# Altium schematic symbol library Блоки трансформаторов импульсных.SCHLIB: 325 symbols (part 2 of 2) (continued)
## БТИ6-46 (continued)
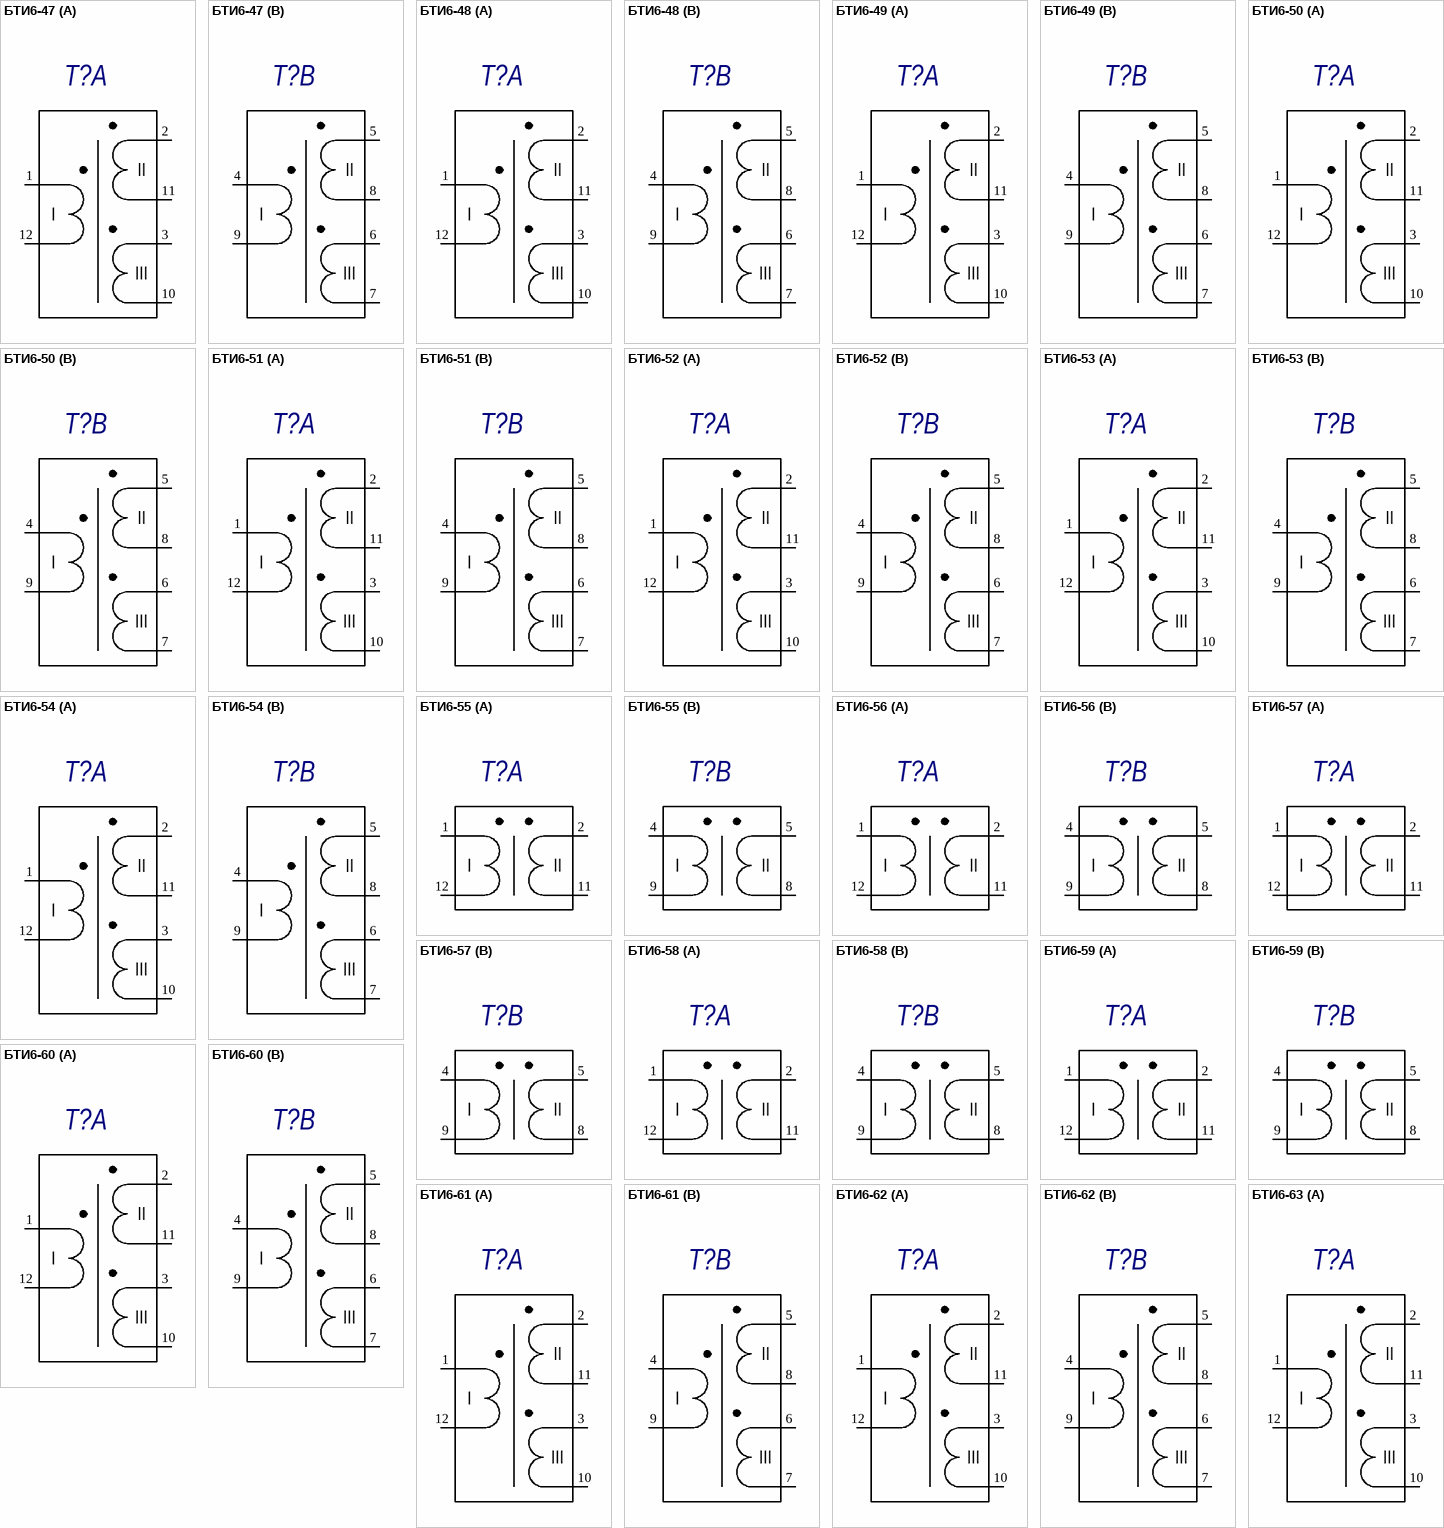
[diagram p22: symbols БТИ6-47 to БТИ6-63]
part A text: II; I; III
part B text: II; I; III

## БТИ6-47
designator T?
БТИ6; Manufacturer: ПАО  «МСТАТОР»; ManufacturerCountry: Россия; Value: {Value}; Наименование элемента: Дроссель; Category: Трансформатор; ComponentLink1Description: Manufacturer Link
footprint БТИ6
part A pins: 1, 2, 3, 10, 11, 12
part B pins: 4, 5, 6, 7, 8, 9
part A text: II; I; III
part B text: II; I; III

## БТИ6-48
designator T?
БТИ6; Manufacturer: ПАО  «МСТАТОР»; ManufacturerCountry: Россия; Value: {Value}; Наименование элемента: Дроссель; Category: Трансформатор; ComponentLink1Description: Manufacturer Link
footprint БТИ6
part A pins: 1, 2, 3, 10, 11, 12
part B pins: 4, 5, 6, 7, 8, 9
part A text: II; I; III
part B text: II; I; III

## БТИ6-49
designator T?
БТИ6; Manufacturer: ПАО  «МСТАТОР»; ManufacturerCountry: Россия; Value: {Value}; Наименование элемента: Дроссель; Category: Трансформатор; ComponentLink1Description: Manufacturer Link
footprint БТИ6
part A pins: 1, 2, 3, 10, 11, 12
part B pins: 4, 5, 6, 7, 8, 9
part A text: II; I; III
part B text: II; I; III

## БТИ6-50
designator T?
БТИ6; Manufacturer: ПАО  «МСТАТОР»; ManufacturerCountry: Россия; Value: {Value}; Наименование элемента: Дроссель; Category: Трансформатор; ComponentLink1Description: Manufacturer Link
footprint БТИ6
part A pins: 1, 2, 3, 10, 11, 12
part B pins: 4, 5, 6, 7, 8, 9
part A text: II; I; III
part B text: II; I; III

## БТИ6-51
designator T?
БТИ6; Manufacturer: ПАО  «МСТАТОР»; ManufacturerCountry: Россия; Value: {Value}; Наименование элемента: Дроссель; Category: Трансформатор; ComponentLink1Description: Manufacturer Link
footprint БТИ6
part A pins: 1, 2, 3, 10, 11, 12
part B pins: 4, 5, 6, 7, 8, 9
part A text: II; I; III
part B text: II; I; III

## БТИ6-52
designator T?
БТИ6; Manufacturer: ПАО  «МСТАТОР»; ManufacturerCountry: Россия; Value: {Value}; Наименование элемента: Дроссель; Category: Трансформатор; ComponentLink1Description: Manufacturer Link
footprint БТИ6
part A pins: 1, 2, 3, 10, 11, 12
part B pins: 4, 5, 6, 7, 8, 9
part A text: II; I; III
part B text: II; I; III

## БТИ6-53
designator T?
БТИ6; Manufacturer: ПАО  «МСТАТОР»; ManufacturerCountry: Россия; Value: {Value}; Наименование элемента: Дроссель; Category: Трансформатор; ComponentLink1Description: Manufacturer Link
footprint БТИ6
part A pins: 1, 2, 3, 10, 11, 12
part B pins: 4, 5, 6, 7, 8, 9
part A text: II; I; III
part B text: II; I; III

## БТИ6-54
designator T?
БТИ6; Manufacturer: ПАО  «МСТАТОР»; ManufacturerCountry: Россия; Value: {Value}; Наименование элемента: Дроссель; Category: Трансформатор; ComponentLink1Description: Manufacturer Link
footprint БТИ6
part A pins: 1, 2, 3, 10, 11, 12
part B pins: 4, 5, 6, 7, 8, 9
part A text: II; I; III
part B text: II; I; III

## БТИ6-55
designator T?
БТИ6; Manufacturer: ПАО  «МСТАТОР»; ManufacturerCountry: Россия; Value: {Value}; Наименование элемента: Дроссель; Category: Трансформатор; ComponentLink1Description: Manufacturer Link
footprint БТИ6
part A pins: 1, 2, 11, 12
part B pins: 4, 5, 8, 9
part A text: I; II
part B text: I; II

## БТИ6-56
designator T?
БТИ6; Manufacturer: ПАО  «МСТАТОР»; ManufacturerCountry: Россия; Value: {Value}; Наименование элемента: Дроссель; Category: Трансформатор; ComponentLink1Description: Manufacturer Link
footprint БТИ6
part A pins: 1, 2, 11, 12
part B pins: 4, 5, 8, 9
part A text: I; II
part B text: I; II

## БТИ6-57
designator T?
БТИ6; Manufacturer: ПАО  «МСТАТОР»; ManufacturerCountry: Россия; Value: {Value}; Наименование элемента: Дроссель; Category: Трансформатор; ComponentLink1Description: Manufacturer Link
footprint БТИ6
part A pins: 1, 2, 11, 12
part B pins: 4, 5, 8, 9
part A text: I; II
part B text: I; II

## БТИ6-58
designator T?
БТИ6; Manufacturer: ПАО  «МСТАТОР»; ManufacturerCountry: Россия; Value: {Value}; Наименование элемента: Дроссель; Category: Трансформатор; ComponentLink1Description: Manufacturer Link
footprint БТИ6
part A pins: 1, 2, 11, 12
part B pins: 4, 5, 8, 9
part A text: I; II
part B text: I; II

## БТИ6-59
designator T?
БТИ6; Manufacturer: ПАО  «МСТАТОР»; ManufacturerCountry: Россия; Value: {Value}; Наименование элемента: Дроссель; Category: Трансформатор; ComponentLink1Description: Manufacturer Link
footprint БТИ6
part A pins: 1, 2, 11, 12
part B pins: 4, 5, 8, 9
part A text: I; II
part B text: I; II

## БТИ6-60
designator T?
БТИ6; Manufacturer: ПАО  «МСТАТОР»; ManufacturerCountry: Россия; Value: {Value}; Наименование элемента: Дроссель; Category: Трансформатор; ComponentLink1Description: Manufacturer Link
footprint БТИ6
part A pins: 1, 2, 3, 10, 11, 12
part B pins: 4, 5, 6, 7, 8, 9
part A text: II; I; III
part B text: II; I; III

## БТИ6-61
designator T?
БТИ6; Manufacturer: ПАО  «МСТАТОР»; ManufacturerCountry: Россия; Value: {Value}; Наименование элемента: Дроссель; Category: Трансформатор; ComponentLink1Description: Manufacturer Link
footprint БТИ6
part A pins: 1, 2, 3, 10, 11, 12
part B pins: 4, 5, 6, 7, 8, 9
part A text: II; I; III
part B text: II; I; III

## БТИ6-62
designator T?
БТИ6; Manufacturer: ПАО  «МСТАТОР»; ManufacturerCountry: Россия; Value: {Value}; Наименование элемента: Дроссель; Category: Трансформатор; ComponentLink1Description: Manufacturer Link
footprint БТИ6
part A pins: 1, 2, 3, 10, 11, 12
part B pins: 4, 5, 6, 7, 8, 9
part A text: II; I; III
part B text: II; I; III

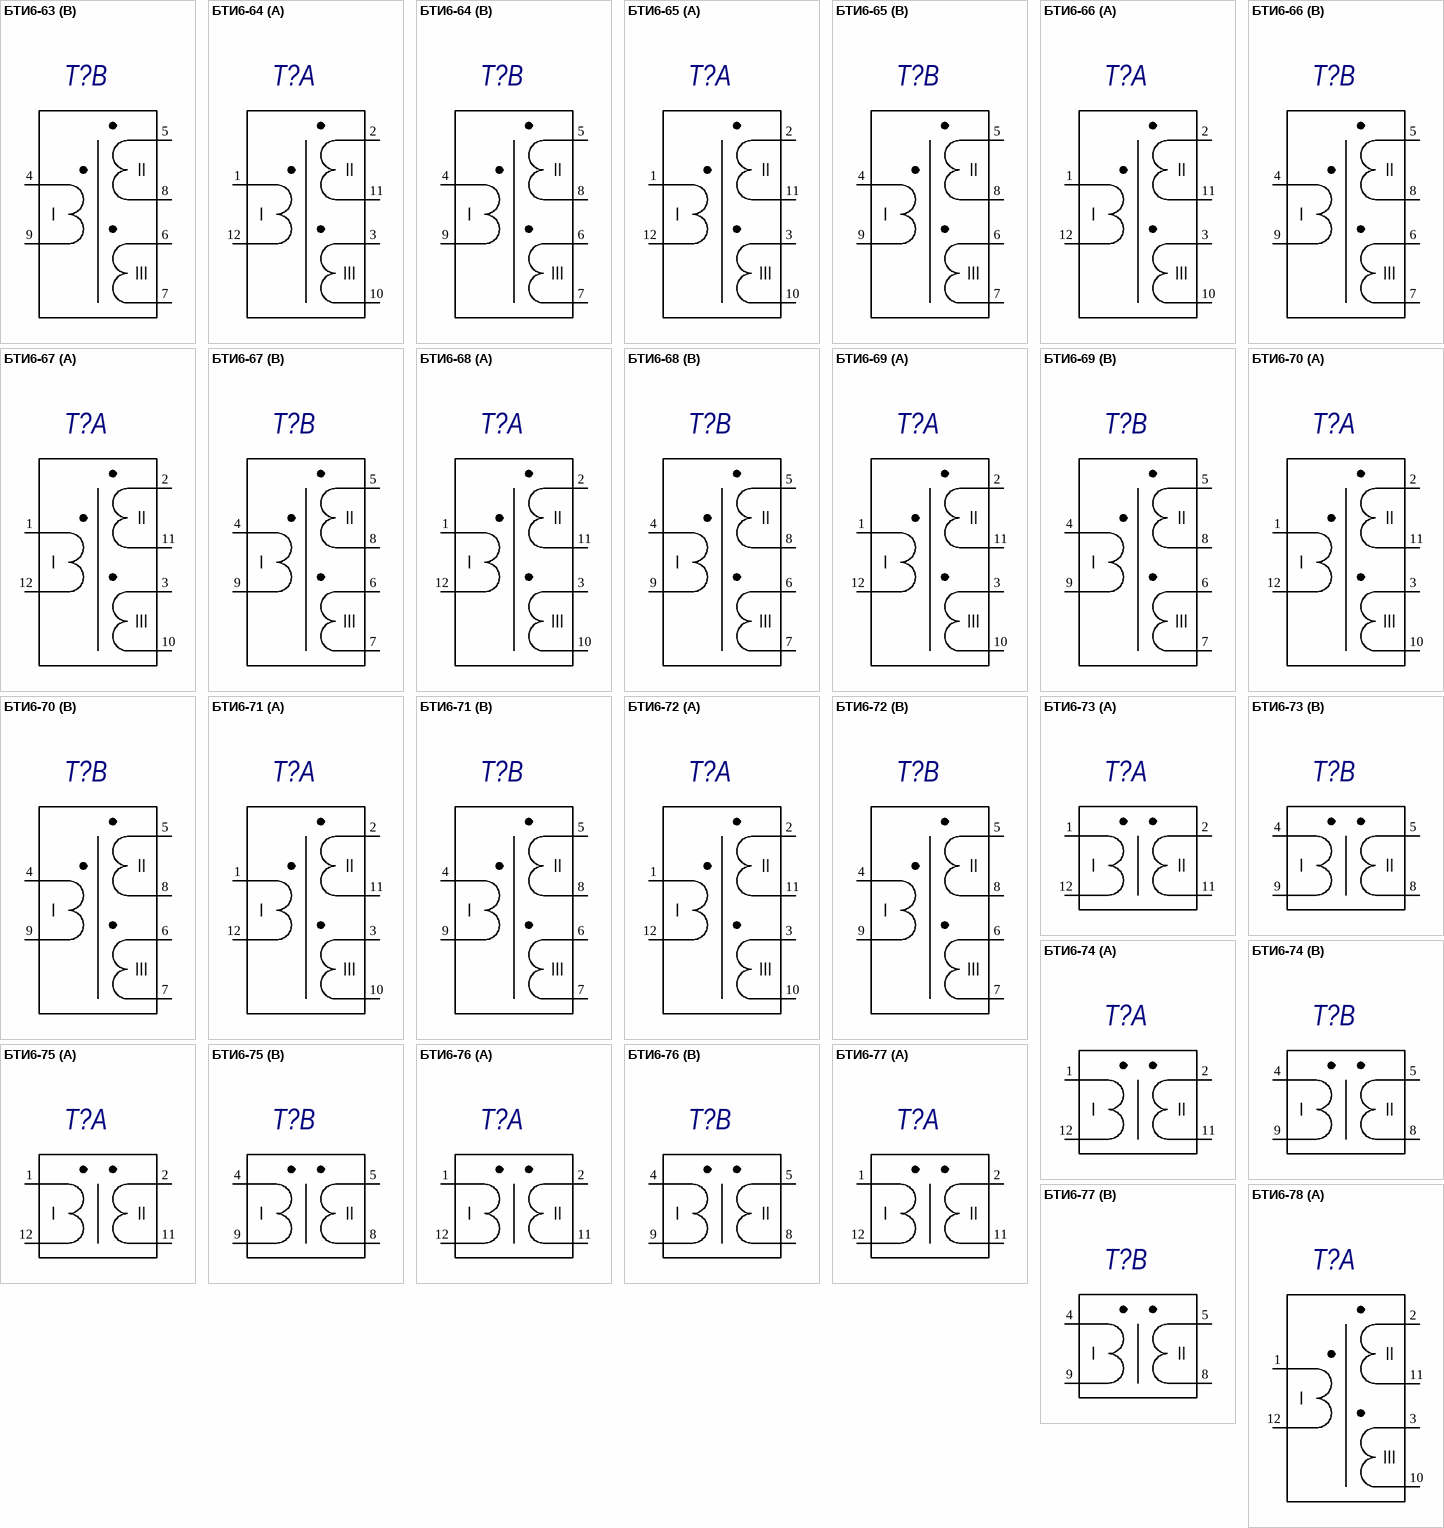
[diagram p23: symbols БТИ6-63 to БТИ6-78]

## БТИ6-63
designator T?
БТИ6; Manufacturer: ПАО  «МСТАТОР»; ManufacturerCountry: Россия; Value: {Value}; Наименование элемента: Дроссель; Category: Трансформатор; ComponentLink1Description: Manufacturer Link
footprint БТИ6
part A pins: 1, 2, 3, 10, 11, 12
part B pins: 4, 5, 6, 7, 8, 9
part A text: II; I; III
part B text: II; I; III

## БТИ6-64
designator T?
БТИ6; Manufacturer: ПАО  «МСТАТОР»; ManufacturerCountry: Россия; Value: {Value}; Наименование элемента: Дроссель; Category: Трансформатор; ComponentLink1Description: Manufacturer Link
footprint БТИ6
part A pins: 1, 2, 3, 10, 11, 12
part B pins: 4, 5, 6, 7, 8, 9
part A text: II; I; III
part B text: II; I; III

## БТИ6-65
designator T?
БТИ6; Manufacturer: ПАО  «МСТАТОР»; ManufacturerCountry: Россия; Value: {Value}; Наименование элемента: Дроссель; Category: Трансформатор; ComponentLink1Description: Manufacturer Link
footprint БТИ6
part A pins: 1, 2, 3, 10, 11, 12
part B pins: 4, 5, 6, 7, 8, 9
part A text: II; I; III
part B text: II; I; III

## БТИ6-66
designator T?
БТИ6; Manufacturer: ПАО  «МСТАТОР»; ManufacturerCountry: Россия; Value: {Value}; Наименование элемента: Дроссель; Category: Трансформатор; ComponentLink1Description: Manufacturer Link
footprint БТИ6
part A pins: 1, 2, 3, 10, 11, 12
part B pins: 4, 5, 6, 7, 8, 9
part A text: II; I; III
part B text: II; I; III

## БТИ6-67
designator T?
БТИ6; Manufacturer: ПАО  «МСТАТОР»; ManufacturerCountry: Россия; Value: {Value}; Наименование элемента: Дроссель; Category: Трансформатор; ComponentLink1Description: Manufacturer Link
footprint БТИ6
part A pins: 1, 2, 3, 10, 11, 12
part B pins: 4, 5, 6, 7, 8, 9
part A text: II; I; III
part B text: II; I; III

## БТИ6-68
designator T?
БТИ6; Manufacturer: ПАО  «МСТАТОР»; ManufacturerCountry: Россия; Value: {Value}; Наименование элемента: Дроссель; Category: Трансформатор; ComponentLink1Description: Manufacturer Link
footprint БТИ6
part A pins: 1, 2, 3, 10, 11, 12
part B pins: 4, 5, 6, 7, 8, 9
part A text: II; I; III
part B text: II; I; III

## БТИ6-69
designator T?
БТИ6; Manufacturer: ПАО  «МСТАТОР»; ManufacturerCountry: Россия; Value: {Value}; Наименование элемента: Дроссель; Category: Трансформатор; ComponentLink1Description: Manufacturer Link
footprint БТИ6
part A pins: 1, 2, 3, 10, 11, 12
part B pins: 4, 5, 6, 7, 8, 9
part A text: II; I; III
part B text: II; I; III

## БТИ6-70
designator T?
БТИ6; Manufacturer: ПАО  «МСТАТОР»; ManufacturerCountry: Россия; Value: {Value}; Наименование элемента: Дроссель; Category: Трансформатор; ComponentLink1Description: Manufacturer Link
footprint БТИ6
part A pins: 1, 2, 3, 10, 11, 12
part B pins: 4, 5, 6, 7, 8, 9
part A text: II; I; III
part B text: II; I; III

## БТИ6-71
designator T?
БТИ6; Manufacturer: ПАО  «МСТАТОР»; ManufacturerCountry: Россия; Value: {Value}; Наименование элемента: Дроссель; Category: Трансформатор; ComponentLink1Description: Manufacturer Link
footprint БТИ6
part A pins: 1, 2, 3, 10, 11, 12
part B pins: 4, 5, 6, 7, 8, 9
part A text: II; I; III
part B text: II; I; III

## БТИ6-72
designator T?
БТИ6; Manufacturer: ПАО  «МСТАТОР»; ManufacturerCountry: Россия; Value: {Value}; Наименование элемента: Дроссель; Category: Трансформатор; ComponentLink1Description: Manufacturer Link
footprint БТИ6
part A pins: 1, 2, 3, 10, 11, 12
part B pins: 4, 5, 6, 7, 8, 9
part A text: II; I; III
part B text: II; I; III

## БТИ6-73
designator T?
БТИ6; Manufacturer: ПАО  «МСТАТОР»; ManufacturerCountry: Россия; Value: {Value}; Наименование элемента: Дроссель; Category: Трансформатор; ComponentLink1Description: Manufacturer Link
footprint БТИ6
part A pins: 1, 2, 11, 12
part B pins: 4, 5, 8, 9
part A text: I; II
part B text: I; II

## БТИ6-74
designator T?
БТИ6; Manufacturer: ПАО  «МСТАТОР»; ManufacturerCountry: Россия; Value: {Value}; Наименование элемента: Дроссель; Category: Трансформатор; ComponentLink1Description: Manufacturer Link
footprint БТИ6
part A pins: 1, 2, 11, 12
part B pins: 4, 5, 8, 9
part A text: I; II
part B text: I; II

## БТИ6-75
designator T?
БТИ6; Manufacturer: ПАО  «МСТАТОР»; ManufacturerCountry: Россия; Value: {Value}; Наименование элемента: Дроссель; Category: Трансформатор; ComponentLink1Description: Manufacturer Link
footprint БТИ6
part A pins: 1, 2, 11, 12
part B pins: 4, 5, 8, 9
part A text: I; II
part B text: I; II

## БТИ6-76
designator T?
БТИ6; Manufacturer: ПАО  «МСТАТОР»; ManufacturerCountry: Россия; Value: {Value}; Наименование элемента: Дроссель; Category: Трансформатор; ComponentLink1Description: Manufacturer Link
footprint БТИ6
part A pins: 1, 2, 11, 12
part B pins: 4, 5, 8, 9
part A text: I; II
part B text: I; II

## БТИ6-77
designator T?
БТИ6; Manufacturer: ПАО  «МСТАТОР»; ManufacturerCountry: Россия; Value: {Value}; Наименование элемента: Дроссель; Category: Трансформатор; ComponentLink1Description: Manufacturer Link
footprint БТИ6
part A pins: 1, 2, 11, 12
part B pins: 4, 5, 8, 9
part A text: I; II
part B text: I; II

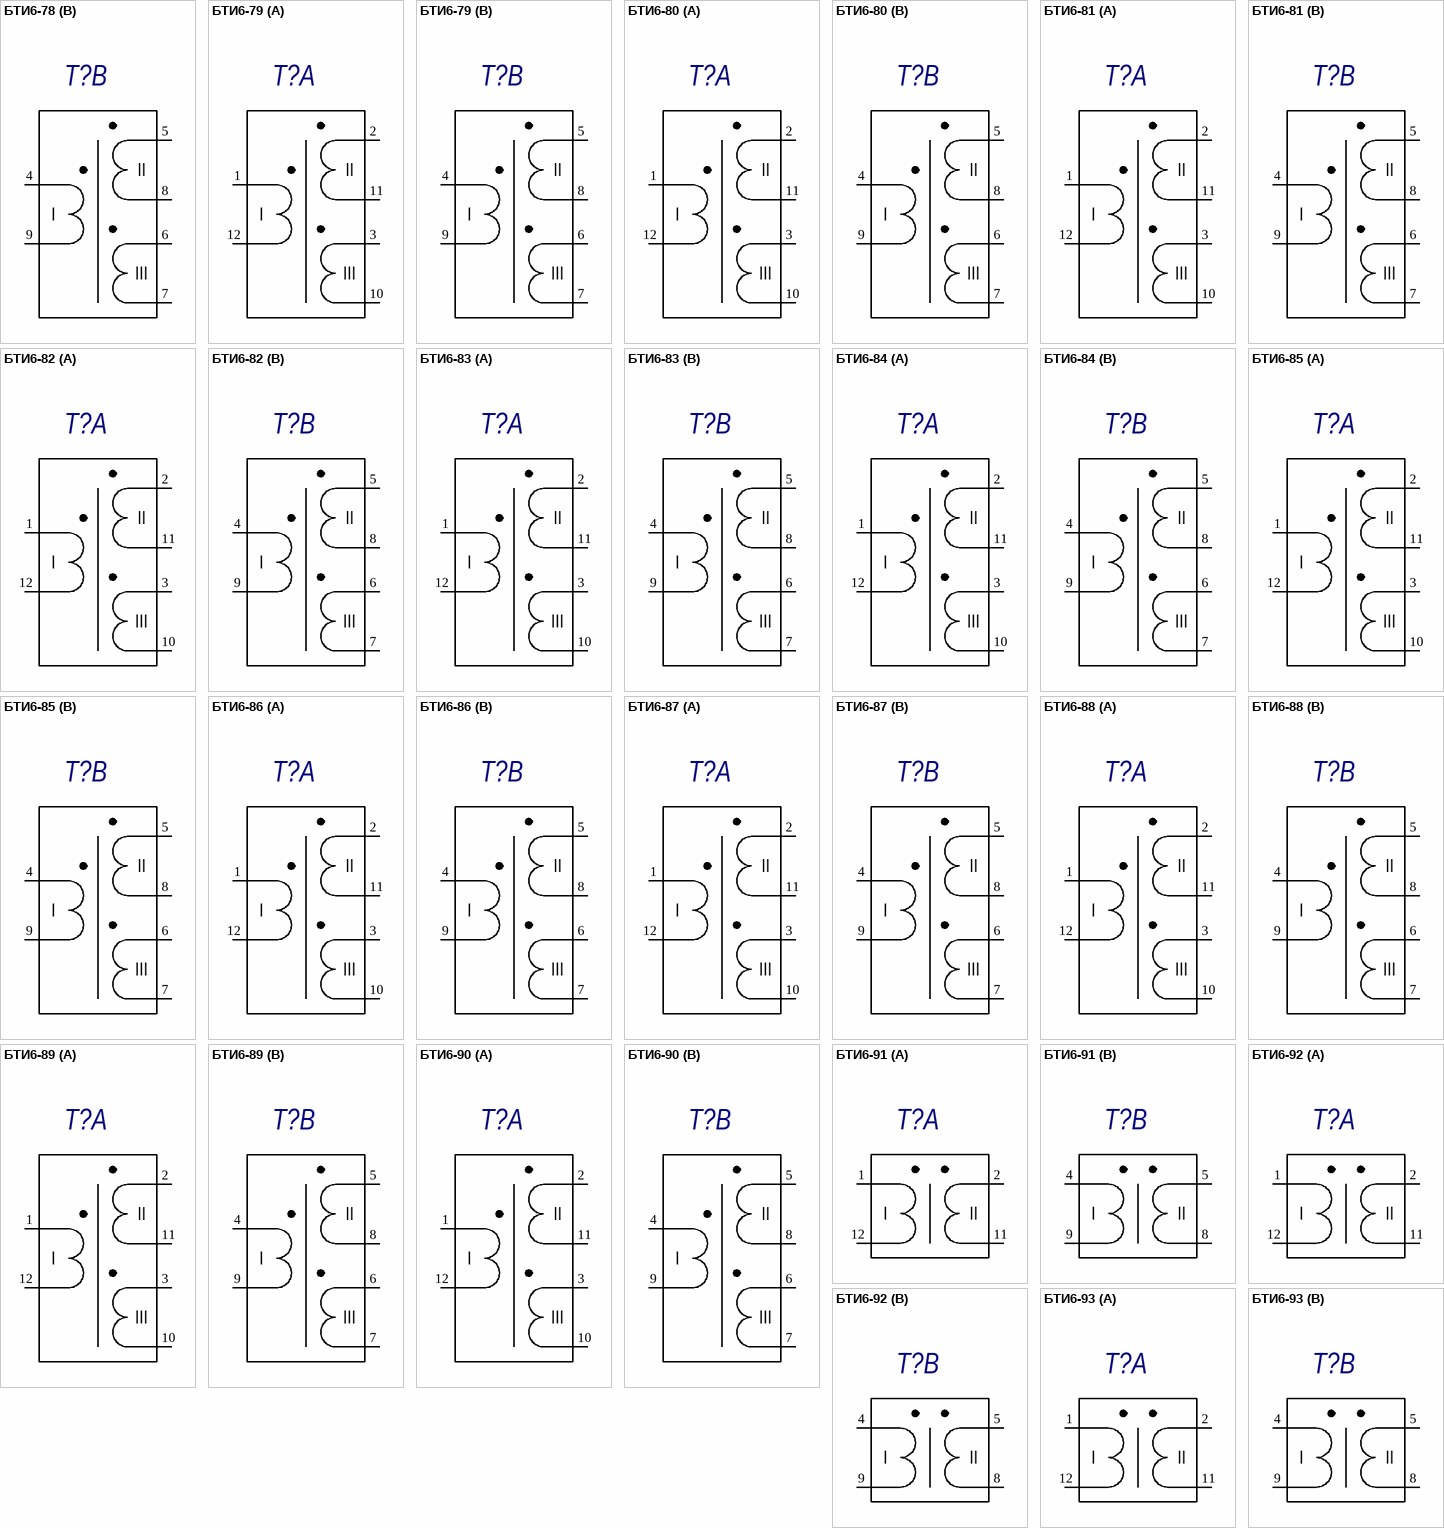
[diagram p24: symbols БТИ6-78 to БТИ6-93]

## БТИ6-78
designator T?
БТИ6; Manufacturer: ПАО  «МСТАТОР»; ManufacturerCountry: Россия; Value: {Value}; Наименование элемента: Дроссель; Category: Трансформатор; ComponentLink1Description: Manufacturer Link
footprint БТИ6
part A pins: 1, 2, 3, 10, 11, 12
part B pins: 4, 5, 6, 7, 8, 9
part A text: II; I; III
part B text: II; I; III

## БТИ6-79
designator T?
БТИ6; Manufacturer: ПАО  «МСТАТОР»; ManufacturerCountry: Россия; Value: {Value}; Наименование элемента: Дроссель; Category: Трансформатор; ComponentLink1Description: Manufacturer Link
footprint БТИ6
part A pins: 1, 2, 3, 10, 11, 12
part B pins: 4, 5, 6, 7, 8, 9
part A text: II; I; III
part B text: II; I; III

## БТИ6-80
designator T?
БТИ6; Manufacturer: ПАО  «МСТАТОР»; ManufacturerCountry: Россия; Value: {Value}; Наименование элемента: Дроссель; Category: Трансформатор; ComponentLink1Description: Manufacturer Link
footprint БТИ6
part A pins: 1, 2, 3, 10, 11, 12
part B pins: 4, 5, 6, 7, 8, 9
part A text: II; I; III
part B text: II; I; III

## БТИ6-81
designator T?
БТИ6; Manufacturer: ПАО  «МСТАТОР»; ManufacturerCountry: Россия; Value: {Value}; Наименование элемента: Дроссель; Category: Трансформатор; ComponentLink1Description: Manufacturer Link
footprint БТИ6
part A pins: 1, 2, 3, 10, 11, 12
part B pins: 4, 5, 6, 7, 8, 9
part A text: II; I; III
part B text: II; I; III

## БТИ6-82
designator T?
БТИ6; Manufacturer: ПАО  «МСТАТОР»; ManufacturerCountry: Россия; Value: {Value}; Наименование элемента: Дроссель; Category: Трансформатор; ComponentLink1Description: Manufacturer Link
footprint БТИ6
part A pins: 1, 2, 3, 10, 11, 12
part B pins: 4, 5, 6, 7, 8, 9
part A text: II; I; III
part B text: II; I; III

## БТИ6-83
designator T?
БТИ6; Manufacturer: ПАО  «МСТАТОР»; ManufacturerCountry: Россия; Value: {Value}; Наименование элемента: Дроссель; Category: Трансформатор; ComponentLink1Description: Manufacturer Link
footprint БТИ6
part A pins: 1, 2, 3, 10, 11, 12
part B pins: 4, 5, 6, 7, 8, 9
part A text: II; I; III
part B text: II; I; III

## БТИ6-84
designator T?
БТИ6; Manufacturer: ПАО  «МСТАТОР»; ManufacturerCountry: Россия; Value: {Value}; Наименование элемента: Дроссель; Category: Трансформатор; ComponentLink1Description: Manufacturer Link
footprint БТИ6
part A pins: 1, 2, 3, 10, 11, 12
part B pins: 4, 5, 6, 7, 8, 9
part A text: II; I; III
part B text: II; I; III

## БТИ6-85
designator T?
БТИ6; Manufacturer: ПАО  «МСТАТОР»; ManufacturerCountry: Россия; Value: {Value}; Наименование элемента: Дроссель; Category: Трансформатор; ComponentLink1Description: Manufacturer Link
footprint БТИ6
part A pins: 1, 2, 3, 10, 11, 12
part B pins: 4, 5, 6, 7, 8, 9
part A text: II; I; III
part B text: II; I; III

## БТИ6-86
designator T?
БТИ6; Manufacturer: ПАО  «МСТАТОР»; ManufacturerCountry: Россия; Value: {Value}; Наименование элемента: Дроссель; Category: Трансформатор; ComponentLink1Description: Manufacturer Link
footprint БТИ6
part A pins: 1, 2, 3, 10, 11, 12
part B pins: 4, 5, 6, 7, 8, 9
part A text: II; I; III
part B text: II; I; III

## БТИ6-87
designator T?
БТИ6; Manufacturer: ПАО  «МСТАТОР»; ManufacturerCountry: Россия; Value: {Value}; Наименование элемента: Дроссель; Category: Трансформатор; ComponentLink1Description: Manufacturer Link
footprint БТИ6
part A pins: 1, 2, 3, 10, 11, 12
part B pins: 4, 5, 6, 7, 8, 9
part A text: II; I; III
part B text: II; I; III

## БТИ6-88
designator T?
БТИ6; Manufacturer: ПАО  «МСТАТОР»; ManufacturerCountry: Россия; Value: {Value}; Наименование элемента: Дроссель; Category: Трансформатор; ComponentLink1Description: Manufacturer Link
footprint БТИ6
part A pins: 1, 2, 3, 10, 11, 12
part B pins: 4, 5, 6, 7, 8, 9
part A text: II; I; III
part B text: II; I; III

## БТИ6-89
designator T?
БТИ6; Manufacturer: ПАО  «МСТАТОР»; ManufacturerCountry: Россия; Value: {Value}; Наименование элемента: Дроссель; Category: Трансформатор; ComponentLink1Description: Manufacturer Link
footprint БТИ6
part A pins: 1, 2, 3, 10, 11, 12
part B pins: 4, 5, 6, 7, 8, 9
part A text: II; I; III
part B text: II; I; III

## БТИ6-90
designator T?
БТИ6; Manufacturer: ПАО  «МСТАТОР»; ManufacturerCountry: Россия; Value: {Value}; Наименование элемента: Дроссель; Category: Трансформатор; ComponentLink1Description: Manufacturer Link
footprint БТИ6
part A pins: 1, 2, 3, 10, 11, 12
part B pins: 4, 5, 6, 7, 8, 9
part A text: II; I; III
part B text: II; I; III

## БТИ6-91
designator T?
БТИ6; Manufacturer: ПАО  «МСТАТОР»; ManufacturerCountry: Россия; Value: {Value}; Наименование элемента: Дроссель; Category: Трансформатор; ComponentLink1Description: Manufacturer Link
footprint БТИ6
part A pins: 1, 2, 11, 12
part B pins: 4, 5, 8, 9
part A text: I; II
part B text: I; II

## БТИ6-92
designator T?
БТИ6; Manufacturer: ПАО  «МСТАТОР»; ManufacturerCountry: Россия; Value: {Value}; Наименование элемента: Дроссель; Category: Трансформатор; ComponentLink1Description: Manufacturer Link
footprint БТИ6
part A pins: 1, 2, 11, 12
part B pins: 4, 5, 8, 9
part A text: I; II
part B text: I; II

## БТИ6-93
designator T?
БТИ6; Manufacturer: ПАО  «МСТАТОР»; ManufacturerCountry: Россия; Value: {Value}; Наименование элемента: Дроссель; Category: Трансформатор; ComponentLink1Description: Manufacturer Link
footprint БТИ6
part A pins: 1, 2, 11, 12
part B pins: 4, 5, 8, 9
part A text: I; II
part B text: I; II

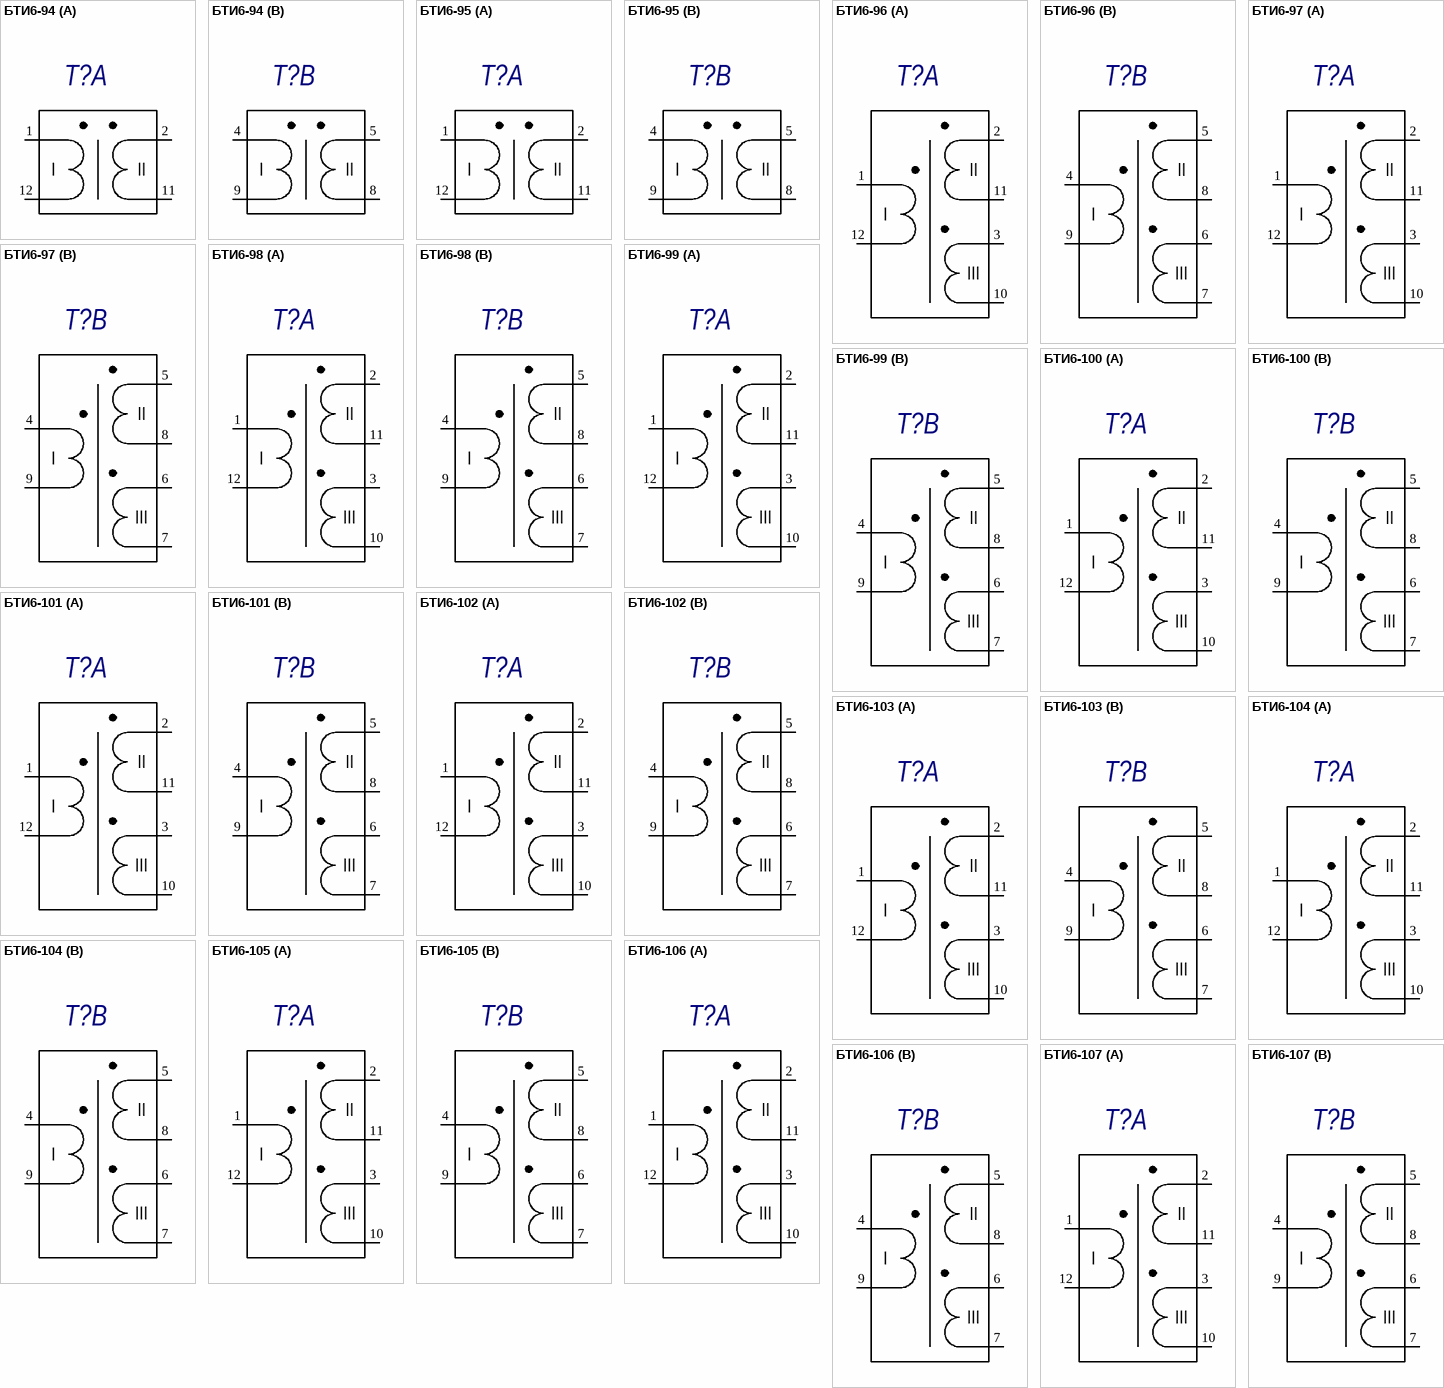
[diagram p25: symbols БТИ6-94 to БТИ6-107]

## БТИ6-94
designator T?
БТИ6; Manufacturer: ПАО  «МСТАТОР»; ManufacturerCountry: Россия; Value: {Value}; Наименование элемента: Дроссель; Category: Трансформатор; ComponentLink1Description: Manufacturer Link
footprint БТИ6
part A pins: 1, 2, 11, 12
part B pins: 4, 5, 8, 9
part A text: I; II
part B text: I; II

## БТИ6-95
designator T?
БТИ6; Manufacturer: ПАО  «МСТАТОР»; ManufacturerCountry: Россия; Value: {Value}; Наименование элемента: Дроссель; Category: Трансформатор; ComponentLink1Description: Manufacturer Link
footprint БТИ6
part A pins: 1, 2, 11, 12
part B pins: 4, 5, 8, 9
part A text: I; II
part B text: I; II

## БТИ6-96
designator T?
БТИ6; Manufacturer: ПАО  «МСТАТОР»; ManufacturerCountry: Россия; Value: {Value}; Наименование элемента: Дроссель; Category: Трансформатор; ComponentLink1Description: Manufacturer Link
footprint БТИ6
part A pins: 1, 2, 3, 10, 11, 12
part B pins: 4, 5, 6, 7, 8, 9
part A text: II; I; III
part B text: II; I; III

## БТИ6-97
designator T?
БТИ6; Manufacturer: ПАО  «МСТАТОР»; ManufacturerCountry: Россия; Value: {Value}; Наименование элемента: Дроссель; Category: Трансформатор; ComponentLink1Description: Manufacturer Link
footprint БТИ6
part A pins: 1, 2, 3, 10, 11, 12
part B pins: 4, 5, 6, 7, 8, 9
part A text: II; I; III
part B text: II; I; III

## БТИ6-98
designator T?
БТИ6; Manufacturer: ПАО  «МСТАТОР»; ManufacturerCountry: Россия; Value: {Value}; Наименование элемента: Дроссель; Category: Трансформатор; ComponentLink1Description: Manufacturer Link
footprint БТИ6
part A pins: 1, 2, 3, 10, 11, 12
part B pins: 4, 5, 6, 7, 8, 9
part A text: II; I; III
part B text: II; I; III

## БТИ6-99
designator T?
БТИ6; Manufacturer: ПАО  «МСТАТОР»; ManufacturerCountry: Россия; Value: {Value}; Наименование элемента: Дроссель; Category: Трансформатор; ComponentLink1Description: Manufacturer Link
footprint БТИ6
part A pins: 1, 2, 3, 10, 11, 12
part B pins: 4, 5, 6, 7, 8, 9
part A text: II; I; III
part B text: II; I; III

## БТИ6-100
designator T?
БТИ6; Manufacturer: ПАО  «МСТАТОР»; ManufacturerCountry: Россия; Value: {Value}; Наименование элемента: Дроссель; Category: Трансформатор; ComponentLink1Description: Manufacturer Link
footprint БТИ6
part A pins: 1, 2, 3, 10, 11, 12
part B pins: 4, 5, 6, 7, 8, 9
part A text: II; I; III
part B text: II; I; III

## БТИ6-101
designator T?
БТИ6; Manufacturer: ПАО  «МСТАТОР»; ManufacturerCountry: Россия; Value: {Value}; Наименование элемента: Дроссель; Category: Трансформатор; ComponentLink1Description: Manufacturer Link
footprint БТИ6
part A pins: 1, 2, 3, 10, 11, 12
part B pins: 4, 5, 6, 7, 8, 9
part A text: II; I; III
part B text: II; I; III

## БТИ6-102
designator T?
БТИ6; Manufacturer: ПАО  «МСТАТОР»; ManufacturerCountry: Россия; Value: {Value}; Наименование элемента: Дроссель; Category: Трансформатор; ComponentLink1Description: Manufacturer Link
footprint БТИ6
part A pins: 1, 2, 3, 10, 11, 12
part B pins: 4, 5, 6, 7, 8, 9
part A text: II; I; III
part B text: II; I; III

## БТИ6-103
designator T?
БТИ6; Manufacturer: ПАО  «МСТАТОР»; ManufacturerCountry: Россия; Value: {Value}; Наименование элемента: Дроссель; Category: Трансформатор; ComponentLink1Description: Manufacturer Link
footprint БТИ6
part A pins: 1, 2, 3, 10, 11, 12
part B pins: 4, 5, 6, 7, 8, 9
part A text: II; I; III
part B text: II; I; III

## БТИ6-104
designator T?
БТИ6; Manufacturer: ПАО  «МСТАТОР»; ManufacturerCountry: Россия; Value: {Value}; Наименование элемента: Дроссель; Category: Трансформатор; ComponentLink1Description: Manufacturer Link
footprint БТИ6
part A pins: 1, 2, 3, 10, 11, 12
part B pins: 4, 5, 6, 7, 8, 9
part A text: II; I; III
part B text: II; I; III

## БТИ6-105
designator T?
БТИ6; Manufacturer: ПАО  «МСТАТОР»; ManufacturerCountry: Россия; Value: {Value}; Наименование элемента: Дроссель; Category: Трансформатор; ComponentLink1Description: Manufacturer Link
footprint БТИ6
part A pins: 1, 2, 3, 10, 11, 12
part B pins: 4, 5, 6, 7, 8, 9
part A text: II; I; III
part B text: II; I; III

## БТИ6-106
designator T?
БТИ6; Manufacturer: ПАО  «МСТАТОР»; ManufacturerCountry: Россия; Value: {Value}; Наименование элемента: Дроссель; Category: Трансформатор; ComponentLink1Description: Manufacturer Link
footprint БТИ6
part A pins: 1, 2, 3, 10, 11, 12
part B pins: 4, 5, 6, 7, 8, 9
part A text: II; I; III
part B text: II; I; III

## БТИ6-107
designator T?
БТИ6; Manufacturer: ПАО  «МСТАТОР»; ManufacturerCountry: Россия; Value: {Value}; Наименование элемента: Дроссель; Category: Трансформатор; ComponentLink1Description: Manufacturer Link
footprint БТИ6
part A pins: 1, 2, 3, 10, 11, 12
part B pins: 4, 5, 6, 7, 8, 9
part A text: II; I; III
part B text: II; I; III

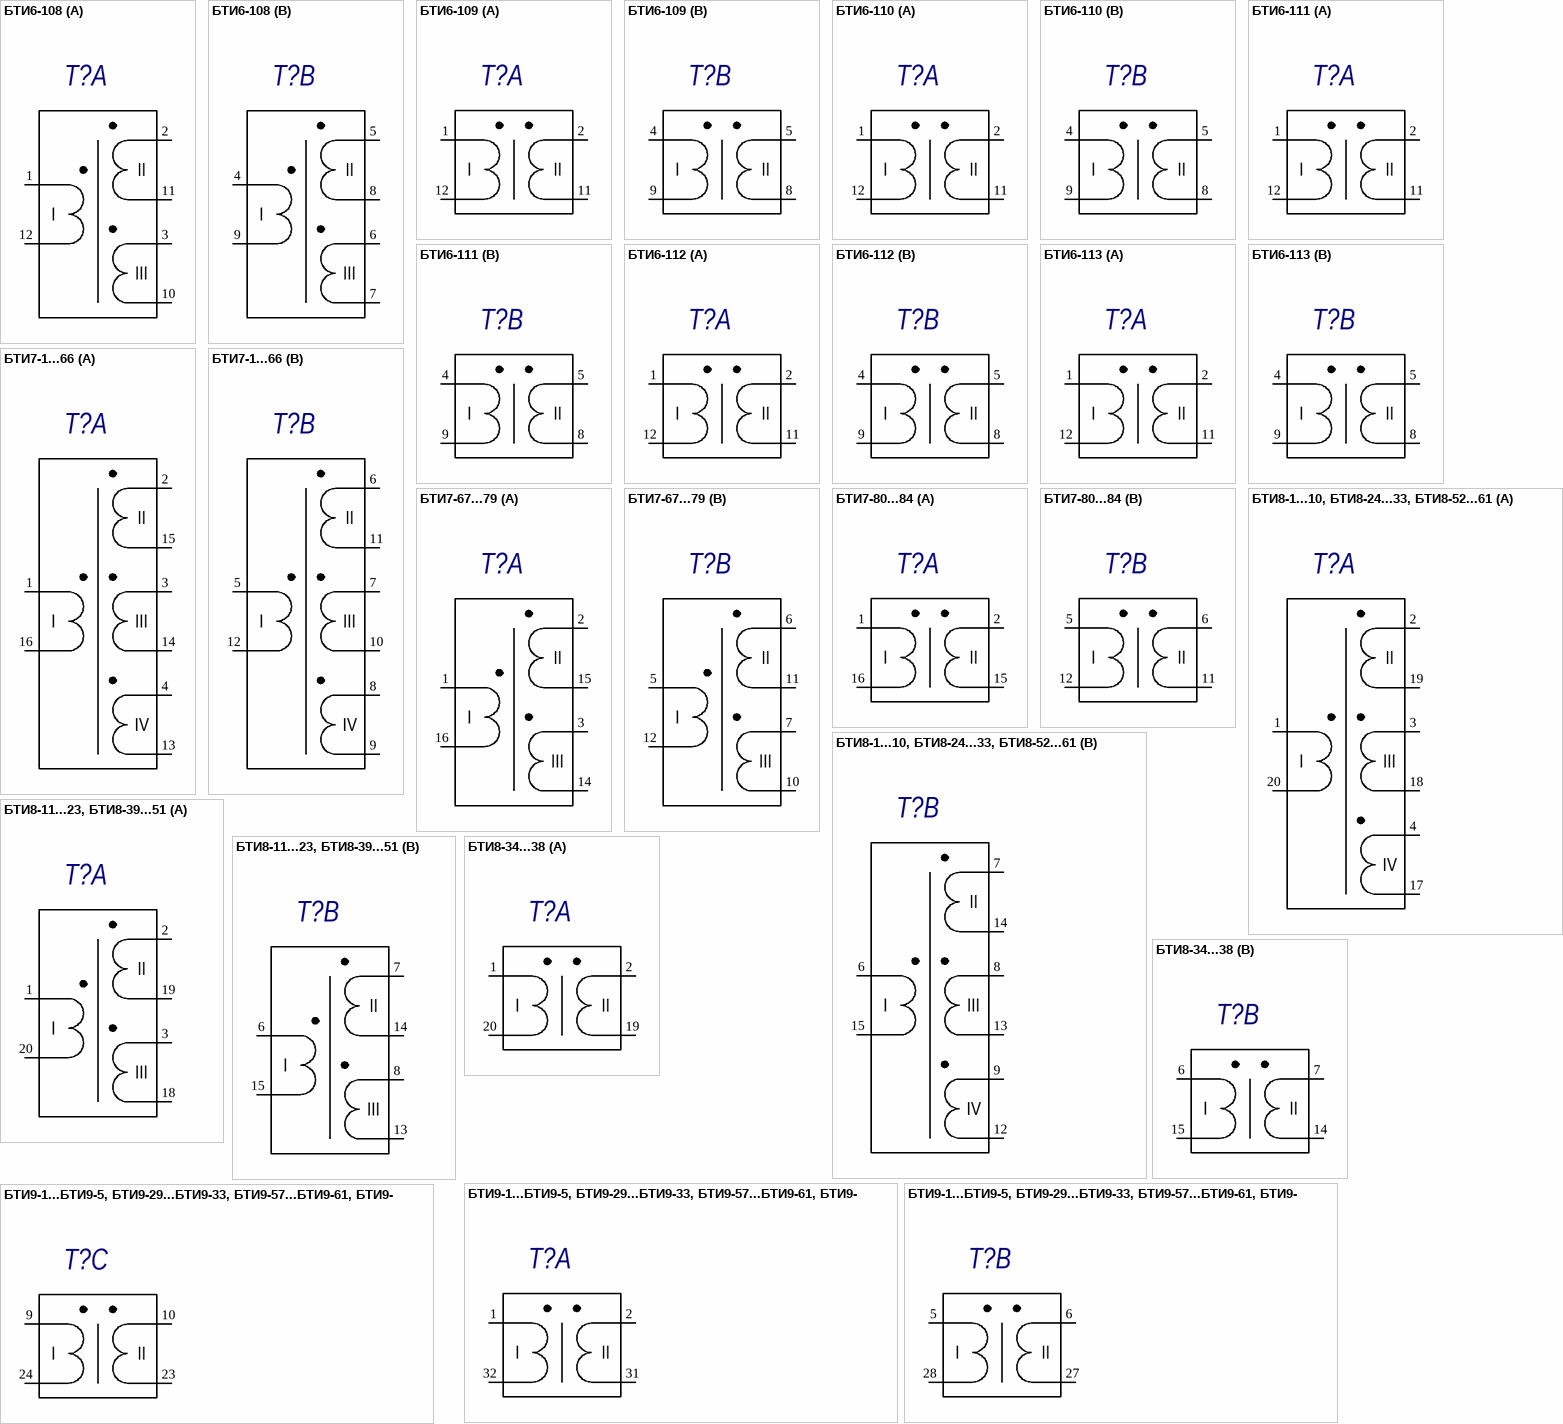
[diagram p26: symbols БТИ6-108 to БТИ9-1...БТИ9-5, БТИ9-29...БТИ9-33, БТИ9-57...БТИ9-61, БТИ9-85...БТИ9-89, БТИ9-113...БТИ9-117, БТИ9-141...БТИ9-145, БТИ9-169...БТИ9-173, БТИ9-197...БТИ9-201, БТИ9-215...БТИ9-219,]

## БТИ6-108
designator T?
БТИ6; Manufacturer: ПАО  «МСТАТОР»; ManufacturerCountry: Россия; Value: {Value}; Наименование элемента: Дроссель; Category: Трансформатор; ComponentLink1Description: Manufacturer Link
footprint БТИ6
part A pins: 1, 2, 3, 10, 11, 12
part B pins: 4, 5, 6, 7, 8, 9
part A text: II; I; III
part B text: II; I; III

## БТИ6-109
designator T?
БТИ6; Manufacturer: ПАО  «МСТАТОР»; ManufacturerCountry: Россия; Value: {Value}; Наименование элемента: Дроссель; Category: Трансформатор; ComponentLink1Description: Manufacturer Link
footprint БТИ6
part A pins: 1, 2, 11, 12
part B pins: 4, 5, 8, 9
part A text: I; II
part B text: I; II

## БТИ6-110
designator T?
БТИ6; Manufacturer: ПАО  «МСТАТОР»; ManufacturerCountry: Россия; Value: {Value}; Наименование элемента: Дроссель; Category: Трансформатор; ComponentLink1Description: Manufacturer Link
footprint БТИ6
part A pins: 1, 2, 11, 12
part B pins: 4, 5, 8, 9
part A text: I; II
part B text: I; II

## БТИ6-111
designator T?
БТИ6; Manufacturer: ПАО  «МСТАТОР»; ManufacturerCountry: Россия; Value: {Value}; Наименование элемента: Дроссель; Category: Трансформатор; ComponentLink1Description: Manufacturer Link
footprint БТИ6
part A pins: 1, 2, 11, 12
part B pins: 4, 5, 8, 9
part A text: I; II
part B text: I; II

## БТИ6-112
designator T?
БТИ6; Manufacturer: ПАО  «МСТАТОР»; ManufacturerCountry: Россия; Value: {Value}; Наименование элемента: Дроссель; Category: Трансформатор; ComponentLink1Description: Manufacturer Link
footprint БТИ6
part A pins: 1, 2, 11, 12
part B pins: 4, 5, 8, 9
part A text: I; II
part B text: I; II

## БТИ6-113
designator T?
БТИ6; Manufacturer: ПАО  «МСТАТОР»; ManufacturerCountry: Россия; Value: {Value}; Наименование элемента: Дроссель; Category: Трансформатор; ComponentLink1Description: Manufacturer Link
footprint БТИ6
part A pins: 1, 2, 11, 12
part B pins: 4, 5, 8, 9
part A text: I; II
part B text: I; II

## БТИ7-1...66
designator T?
БТИ7; Manufacturer: ПАО  «МСТАТОР»; ManufacturerCountry: Россия; Value: {Value}; Наименование элемента: Дроссель; Category: Трансформатор; ComponentLink1Description: Manufacturer Link
footprint БТИ7
part A pins: 1, 2, 3, 4, 13, 14, 15, 16
part B pins: 5, 6, 7, 8, 9, 10, 11, 12
part A text: II; I; III; IV
part B text: II; I; III; IV

## БТИ7-67...79
designator T?
БТИ7; Manufacturer: ПАО  «МСТАТОР»; ManufacturerCountry: Россия; Value: {Value}; Наименование элемента: Дроссель; Category: Трансформатор; ComponentLink1Description: Manufacturer Link
footprint БТИ7
part A pins: 1, 2, 3, 14, 15, 16
part B pins: 5, 6, 7, 10, 11, 12
part A text: II; I; III
part B text: II; I; III

## БТИ7-80...84
designator T?
БТИ7; Manufacturer: ПАО  «МСТАТОР»; ManufacturerCountry: Россия; Value: {Value}; Наименование элемента: Дроссель; Category: Трансформатор; ComponentLink1Description: Manufacturer Link
footprint БТИ7
part A pins: 1, 2, 15, 16
part B pins: 5, 6, 11, 12
part A text: I; II
part B text: I; II

## БТИ8-1...10, БТИ8-24...33, БТИ8-52...61
designator T?
БТИ8; Manufacturer: ПАО  «МСТАТОР»; ManufacturerCountry: Россия; Value: {Value}; Наименование элемента: Дроссель; Category: Трансформатор; ComponentLink1Description: Manufacturer Link
footprint БТИ8
part A pins: 1, 2, 3, 4, 17, 18, 19, 20
part B pins: 6, 7, 8, 9, 12, 13, 14, 15
part A text: II; I; III; IV
part B text: II; I; III; IV

## БТИ8-11...23, БТИ8-39...51
designator T?
БТИ8; Manufacturer: ПАО  «МСТАТОР»; ManufacturerCountry: Россия; Value: {Value}; Наименование элемента: Дроссель; Category: Трансформатор; ComponentLink1Description: Manufacturer Link
footprint БТИ8
part A pins: 1, 2, 3, 18, 19, 20
part B pins: 6, 7, 8, 13, 14, 15
part A text: II; I; III
part B text: II; I; III

## БТИ8-34...38
designator T?
БТИ8; Manufacturer: ПАО  «МСТАТОР»; ManufacturerCountry: Россия; Value: {Value}; Наименование элемента: Дроссель; Category: Трансформатор; ComponentLink1Description: Manufacturer Link
footprint БТИ8
part A pins: 1, 2, 19, 20
part B pins: 6, 7, 14, 15
part A text: I; II
part B text: I; II

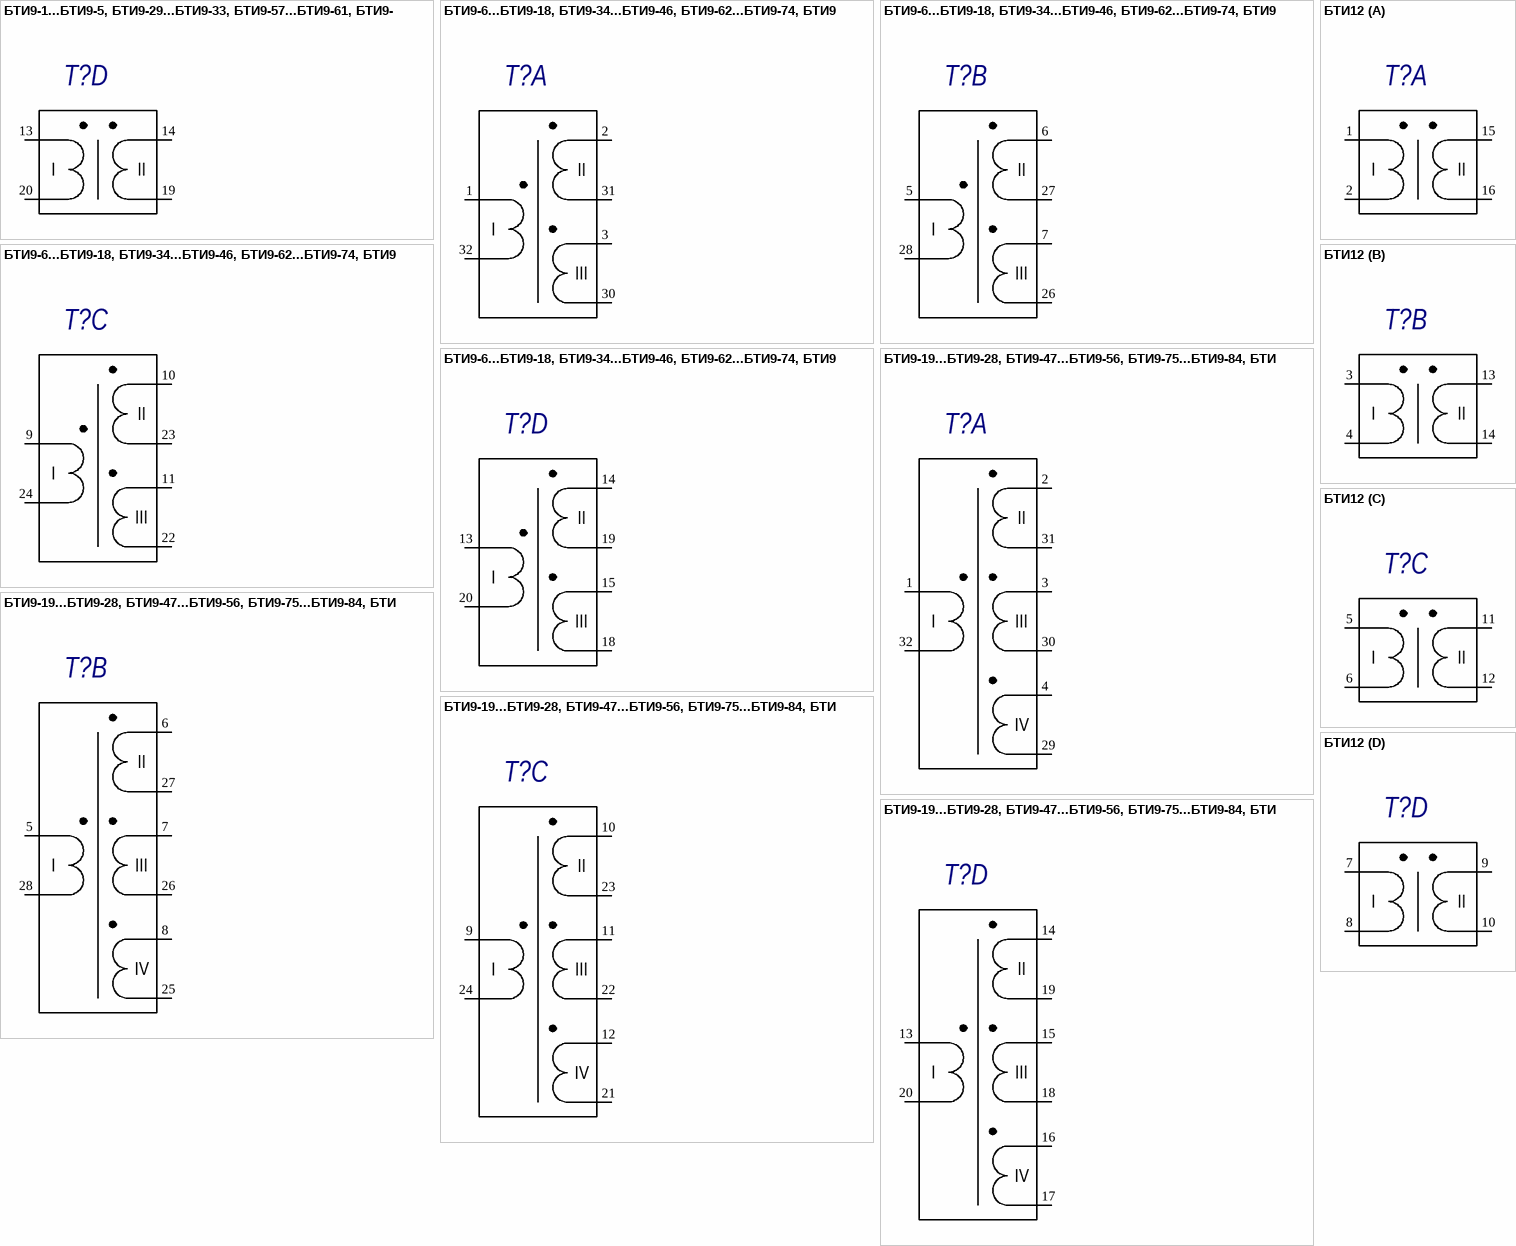
[diagram p27: symbols БТИ9-1...БТИ9-5, БТИ9-29...БТИ9-33, БТИ9-57...БТИ9-61, БТИ9-85...БТИ9-89, БТИ9-113...БТИ9-117, БТИ9-141...БТИ9-145, БТИ9-169...БТИ9-173, БТИ9-197...БТИ9-201, БТИ9-215...БТИ9-219, to БТИ12]

## БТИ9-1...БТИ9-5, БТИ9-29...БТИ9-33, БТИ9-57...БТИ9-61, БТИ9-85...БТИ9-89, БТИ9-113...БТИ9-117, БТИ9-141...БТИ9-145, БТИ9-169...БТИ9-173, БТИ9-197...БТИ9-201, БТИ9-215...БТИ9-219,
designator T?
БТИ9; Manufacturer: ПАО  «МСТАТОР»; ManufacturerCountry: Россия; Value: {Value}; Наименование элемента: Дроссель; Category: Трансформатор; ComponentLink1Description: Manufacturer Link
footprint БТИ9
part A pins: 1, 2, 31, 32
part B pins: 5, 6, 27, 28
part C pins: 9, 10, 23, 24
part D pins: 13, 14, 19, 20
part A text: I; II
part B text: I; II
part C text: I; II
part D text: I; II

## БТИ9-6...БТИ9-18, БТИ9-34...БТИ9-46, БТИ9-62...БТИ9-74, БТИ9-90...БТИ9-102, БТИ9-118...БТИ9-130, БТИ9-146...БТИ9-158, БТИ9-174...БТИ9-186, БТИ9-202...БТИ9-214, БТИ9-220...БТИ9-232
designator T?
БТИ9; Manufacturer: ПАО  «МСТАТОР»; ManufacturerCountry: Россия; Value: {Value}; Наименование элемента: Дроссель; Category: Трансформатор; ComponentLink1Description: Manufacturer Link
footprint БТИ9
part A pins: 1, 2, 3, 30, 31, 32
part B pins: 5, 6, 7, 26, 27, 28
part C pins: 9, 10, 11, 22, 23, 24
part D pins: 13, 14, 15, 18, 19, 20
part A text: II; I; III
part B text: II; I; III
part C text: II; I; III
part D text: II; I; III

## БТИ9-19...БТИ9-28, БТИ9-47...БТИ9-56, БТИ9-75...БТИ9-84, БТИ9-103...БТИ9-112, БТИ9-131...БТИ9-140, БТИ9-159...БТИ9-168, БТИ9-187...БТИ9-196
designator T?
БТИ9; Manufacturer: ПАО  «МСТАТОР»; ManufacturerCountry: Россия; Value: {Value}; Наименование элемента: Дроссель; Category: Трансформатор; ComponentLink1Description: Manufacturer Link
footprint БТИ9
part A pins: 1, 2, 3, 4, 29, 30, 31, 32
part B pins: 5, 6, 7, 8, 25, 26, 27, 28
part C pins: 9, 10, 11, 12, 21, 22, 23, 24
part D pins: 13, 14, 15, 16, 17, 18, 19, 20
part A text: II; I; III; IV
part B text: II; I; III; IV
part C text: II; I; III; IV
part D text: II; I; III; IV

## БТИ12
designator T?
БТИ12; Manufacturer: ПАО  «МСТАТОР»; ManufacturerCountry: Россия; Value: {Value}; Наименование элемента: Дроссель; Category: Трансформатор; ComponentLink1Description: Manufacturer Link
footprint БТИ12
part A pins: 1, 2, 15, 16
part B pins: 3, 4, 13, 14
part C pins: 5, 6, 11, 12
part D pins: 7, 8, 9, 10
part A text: I; II
part B text: I; II
part C text: I; II
part D text: I; II